# Altium schematic symbol library jlcpcb_2025_04_resistors_extended_0201.schlib: 1508 symbols (part 5 of 8) (continued)
## RC0201FR-07178KL
designator R?  Resistance: 178kΩ  (hidden comment: *)
Resistor, 178kΩ, ±1%, 50mW, ±200ppm/℃, -55℃~+125℃, SMD 0201; Manufacturer: Uniroyal; Manufacturer Part Number: RC0201FR-07178KL; Supplier 1: LCSC; Supplier Part Number 1: C474554; JLCPCB Part Number: C474554; Power Rating: 50mW; Category: Resistors; Package Size: 0201; JLCPCB Basic Part: Yes; Tolerance: ±1%; Temperature Coefficient: ±200ppm/℃; Temperature Rating: -55℃~+125℃; ComponentLink1Description: Datasheet; ComponentLink1URL: https://wmsc.lcsc.com/wmsc/upload/file/pdf/v2/lcsc/2311211101_YAGEO-RC0201FR-07178KL_C474554.pdf; ComponentLink2Description: JLCPCB Part URL; ComponentLink2URL: https://jlcpcb.com/partdetail/C474554
pins: 1, 2
1 alternate drawing of the same symbol

## RC0201FR-07180KL
designator R?  Resistance: 180kΩ  (hidden comment: *)
Resistor, 180kΩ, ±1%, 50mW, 25V, ±200ppm/℃, -55℃~+125℃, SMD 0201; Manufacturer: Uniroyal; Manufacturer Part Number: RC0201FR-07180KL; Supplier 1: LCSC; Supplier Part Number 1: C295779; JLCPCB Part Number: C295779; Power Rating: 50mW; Category: Resistors; Package Size: 0201; JLCPCB Basic Part: Yes; Tolerance: ±1%; Voltage Rating: 25V; Temperature Coefficient: ±200ppm/℃; Temperature Rating: -55℃~+125℃; ComponentLink1Description: Datasheet; ComponentLink1URL: https://wmsc.lcsc.com/wmsc/upload/file/pdf/v2/lcsc/2304140030_YAGEO-RC0201FR-07180KL_C295779.pdf; ComponentLink2Description: JLCPCB Part URL; ComponentLink2URL: https://jlcpcb.com/partdetail/C295779
pins: 1, 2
1 alternate drawing of the same symbol

## RC0201FR-07180RL
designator R?  Resistance: 180Ω  (hidden comment: *)
Resistor, 180Ω, ±1%, 50mW, 25V, ±200ppm/℃, -55℃~+125℃, SMD 0201; Manufacturer: Uniroyal; Manufacturer Part Number: RC0201FR-07180RL; Supplier 1: LCSC; Supplier Part Number 1: C138168; JLCPCB Part Number: C138168; Power Rating: 50mW; Category: Resistors; Package Size: 0201; JLCPCB Basic Part: Yes; Tolerance: ±1%; Voltage Rating: 25V; Temperature Coefficient: ±200ppm/℃; Temperature Rating: -55℃~+125℃; ComponentLink1Description: Datasheet; ComponentLink1URL: https://wmsc.lcsc.com/wmsc/upload/file/pdf/v2/lcsc/2304140030_YAGEO-RC0201FR-07180RL_C138168.pdf; ComponentLink2Description: JLCPCB Part URL; ComponentLink2URL: https://jlcpcb.com/partdetail/C138168
pins: 1, 2
1 alternate drawing of the same symbol

## RC0201FR-07182KL
designator R?  Resistance: 182kΩ  (hidden comment: *)
Resistor, 182kΩ, ±1%, 50mW, 25V, ±200ppm/℃, -55℃~+125℃, SMD 0201; Manufacturer: Uniroyal; Manufacturer Part Number: RC0201FR-07182KL; Supplier 1: LCSC; Supplier Part Number 1: C474559; JLCPCB Part Number: C474559; Power Rating: 50mW; Category: Resistors; Package Size: 0201; JLCPCB Basic Part: Yes; Tolerance: ±1%; Voltage Rating: 25V; Temperature Coefficient: ±200ppm/℃; Temperature Rating: -55℃~+125℃; ComponentLink1Description: Datasheet; ComponentLink1URL: https://wmsc.lcsc.com/wmsc/upload/file/pdf/v2/lcsc/2311211101_YAGEO-RC0201FR-07182KL_C474559.pdf; ComponentLink2Description: JLCPCB Part URL; ComponentLink2URL: https://jlcpcb.com/partdetail/C474559
pins: 1, 2
1 alternate drawing of the same symbol

## RC0201FR-07187KL
designator R?  Resistance: 187kΩ  (hidden comment: *)
Resistor, 187kΩ, ±1%, 50mW, ±200ppm/℃, -55℃~+125℃, SMD 0201; Manufacturer: Uniroyal; Manufacturer Part Number: RC0201FR-07187KL; Supplier 1: LCSC; Supplier Part Number 1: C474561; JLCPCB Part Number: C474561; Power Rating: 50mW; Category: Resistors; Package Size: 0201; JLCPCB Basic Part: Yes; Tolerance: ±1%; Temperature Coefficient: ±200ppm/℃; Temperature Rating: -55℃~+125℃; ComponentLink1Description: Datasheet; ComponentLink1URL: https://wmsc.lcsc.com/wmsc/upload/file/pdf/v2/lcsc/2311211101_YAGEO-RC0201FR-07187KL_C474561.pdf; ComponentLink2Description: JLCPCB Part URL; ComponentLink2URL: https://jlcpcb.com/partdetail/C474561
pins: 1, 2
1 alternate drawing of the same symbol

## RC0201FR-07196KL
designator R?  Resistance: 196kΩ  (hidden comment: *)
Resistor, 196kΩ, ±1%, 50mW, 25V, ±200ppm/℃, -55℃~+125℃, SMD 0201; Manufacturer: Uniroyal; Manufacturer Part Number: RC0201FR-07196KL; Supplier 1: LCSC; Supplier Part Number 1: C273319; JLCPCB Part Number: C273319; Power Rating: 50mW; Category: Resistors; Package Size: 0201; JLCPCB Basic Part: Yes; Tolerance: ±1%; Voltage Rating: 25V; Temperature Coefficient: ±200ppm/℃; Temperature Rating: -55℃~+125℃; ComponentLink1Description: Datasheet; ComponentLink1URL: https://wmsc.lcsc.com/wmsc/upload/file/pdf/v2/lcsc/2304140030_YAGEO-RC0201FR-07196KL_C273319.pdf; ComponentLink2Description: JLCPCB Part URL; ComponentLink2URL: https://jlcpcb.com/partdetail/C273319
pins: 1, 2
1 alternate drawing of the same symbol

## RC0201FR-07196RL
designator R?  Resistance: 196Ω  (hidden comment: *)
Resistor, 196Ω, ±1%, 50mW, 25V, ±200ppm/℃, -55℃~+125℃, SMD 0201; Manufacturer: Uniroyal; Manufacturer Part Number: RC0201FR-07196RL; Supplier 1: LCSC; Supplier Part Number 1: C138167; JLCPCB Part Number: C138167; Power Rating: 50mW; Category: Resistors; Package Size: 0201; JLCPCB Basic Part: Yes; Tolerance: ±1%; Voltage Rating: 25V; Temperature Coefficient: ±200ppm/℃; Temperature Rating: -55℃~+125℃; ComponentLink1Description: Datasheet; ComponentLink1URL: https://wmsc.lcsc.com/wmsc/upload/file/pdf/v2/lcsc/2304140030_YAGEO-RC0201FR-07196RL_C138167.pdf; ComponentLink2Description: JLCPCB Part URL; ComponentLink2URL: https://jlcpcb.com/partdetail/C138167
pins: 1, 2
1 alternate drawing of the same symbol

## RC0201FR-07200KL
designator R?  Resistance: 200kΩ  (hidden comment: *)
Resistor, 200kΩ, ±1%, 50mW, 25V, ±200ppm/℃, -55℃~+125℃, SMD 0201; Manufacturer: Uniroyal; Manufacturer Part Number: RC0201FR-07200KL; Supplier 1: LCSC; Supplier Part Number 1: C138163; JLCPCB Part Number: C138163; Power Rating: 50mW; Category: Resistors; Package Size: 0201; JLCPCB Basic Part: Yes; Tolerance: ±1%; Voltage Rating: 25V; Temperature Coefficient: ±200ppm/℃; Temperature Rating: -55℃~+125℃; ComponentLink1Description: Datasheet; ComponentLink1URL: https://wmsc.lcsc.com/wmsc/upload/file/pdf/v2/lcsc/2304140030_YAGEO-RC0201FR-07200KL_C138163.pdf; ComponentLink2Description: JLCPCB Part URL; ComponentLink2URL: https://jlcpcb.com/partdetail/C138163
pins: 1, 2
1 alternate drawing of the same symbol

## RC0201FR-07200RL
designator R?  Resistance: 200Ω  (hidden comment: *)
Resistor, 200Ω, ±1%, 50mW, 25V, ±200ppm/℃, -55℃~+125℃, SMD 0201; Manufacturer: Uniroyal; Manufacturer Part Number: RC0201FR-07200RL; Supplier 1: LCSC; Supplier Part Number 1: C274337; JLCPCB Part Number: C274337; Power Rating: 50mW; Category: Resistors; Package Size: 0201; JLCPCB Basic Part: Yes; Tolerance: ±1%; Voltage Rating: 25V; Temperature Coefficient: ±200ppm/℃; Temperature Rating: -55℃~+125℃; ComponentLink1Description: Datasheet; ComponentLink1URL: https://wmsc.lcsc.com/wmsc/upload/file/pdf/v2/lcsc/2304140030_YAGEO-RC0201FR-07200RL_C274337.pdf; ComponentLink2Description: JLCPCB Part URL; ComponentLink2URL: https://jlcpcb.com/partdetail/C274337
pins: 1, 2
1 alternate drawing of the same symbol

## RC0201FR-07210RL
designator R?  Resistance: 210Ω  (hidden comment: *)
Resistor, 210Ω, ±1%, 50mW, 25V, ±200ppm/℃, -55℃~+125℃, SMD 0201; Manufacturer: Uniroyal; Manufacturer Part Number: RC0201FR-07210RL; Supplier 1: LCSC; Supplier Part Number 1: C474604; JLCPCB Part Number: C474604; Power Rating: 50mW; Category: Resistors; Package Size: 0201; JLCPCB Basic Part: Yes; Tolerance: ±1%; Voltage Rating: 25V; Temperature Coefficient: ±200ppm/℃; Temperature Rating: -55℃~+125℃; ComponentLink1Description: Datasheet; ComponentLink1URL: https://wmsc.lcsc.com/wmsc/upload/file/pdf/v2/lcsc/2311211101_YAGEO-RC0201FR-07210RL_C474604.pdf; ComponentLink2Description: JLCPCB Part URL; ComponentLink2URL: https://jlcpcb.com/partdetail/C474604
pins: 1, 2
1 alternate drawing of the same symbol

## RC0201FR-07215KL
designator R?  Resistance: 215kΩ  (hidden comment: *)
Resistor, 215kΩ, ±1%, 50mW, ±200ppm/℃, -55℃~+125℃, SMD 0201; Manufacturer: Uniroyal; Manufacturer Part Number: RC0201FR-07215KL; Supplier 1: LCSC; Supplier Part Number 1: C474605; JLCPCB Part Number: C474605; Power Rating: 50mW; Category: Resistors; Package Size: 0201; JLCPCB Basic Part: Yes; Tolerance: ±1%; Temperature Coefficient: ±200ppm/℃; Temperature Rating: -55℃~+125℃; ComponentLink1Description: Datasheet; ComponentLink1URL: https://wmsc.lcsc.com/wmsc/upload/file/pdf/v2/lcsc/2311211101_YAGEO-RC0201FR-07215KL_C474605.pdf; ComponentLink2Description: JLCPCB Part URL; ComponentLink2URL: https://jlcpcb.com/partdetail/C474605
pins: 1, 2
1 alternate drawing of the same symbol

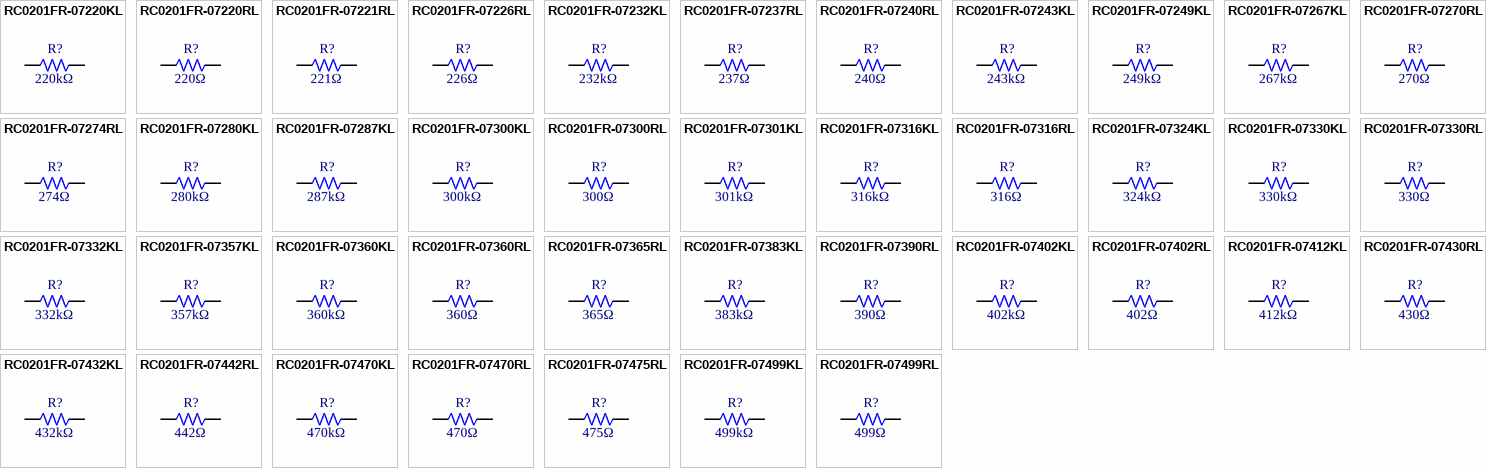
[diagram p21: symbols RC0201FR-07220KL to RC0201FR-07499RL]

## RC0201FR-07220KL
designator R?  Resistance: 220kΩ  (hidden comment: *)
Resistor, 220kΩ, ±1%, 50mW, 25V, ±200ppm/℃, -55℃~+125℃, SMD 0201; Manufacturer: Uniroyal; Manufacturer Part Number: RC0201FR-07220KL; Supplier 1: LCSC; Supplier Part Number 1: C142020; JLCPCB Part Number: C142020; Power Rating: 50mW; Category: Resistors; Package Size: 0201; JLCPCB Basic Part: Yes; Tolerance: ±1%; Voltage Rating: 25V; Temperature Coefficient: ±200ppm/℃; Temperature Rating: -55℃~+125℃; ComponentLink1Description: Datasheet; ComponentLink1URL: https://wmsc.lcsc.com/wmsc/upload/file/pdf/v2/lcsc/2304140030_YAGEO-RC0201FR-07220KL_C142020.pdf; ComponentLink2Description: JLCPCB Part URL; ComponentLink2URL: https://jlcpcb.com/partdetail/C142020
pins: 1, 2
1 alternate drawing of the same symbol

## RC0201FR-07220RL
designator R?  Resistance: 220Ω  (hidden comment: *)
Resistor, 220Ω, ±1%, 50mW, 25V, ±200ppm/℃, -55℃~+125℃, SMD 0201; Manufacturer: Uniroyal; Manufacturer Part Number: RC0201FR-07220RL; Supplier 1: LCSC; Supplier Part Number 1: C274342; JLCPCB Part Number: C274342; Power Rating: 50mW; Category: Resistors; Package Size: 0201; JLCPCB Basic Part: Yes; Tolerance: ±1%; Voltage Rating: 25V; Temperature Coefficient: ±200ppm/℃; Temperature Rating: -55℃~+125℃; ComponentLink1Description: Datasheet; ComponentLink1URL: https://wmsc.lcsc.com/wmsc/upload/file/pdf/v2/lcsc/2304140030_YAGEO-RC0201FR-07220RL_C274342.pdf; ComponentLink2Description: JLCPCB Part URL; ComponentLink2URL: https://jlcpcb.com/partdetail/C274342
pins: 1, 2
1 alternate drawing of the same symbol

## RC0201FR-07221RL
designator R?  Resistance: 221Ω  (hidden comment: *)
Resistor, 221Ω, ±1%, 50mW, 25V, ±200ppm/℃, -55℃~+125℃, SMD 0201; Manufacturer: Uniroyal; Manufacturer Part Number: RC0201FR-07221RL; Supplier 1: LCSC; Supplier Part Number 1: C138161; JLCPCB Part Number: C138161; Power Rating: 50mW; Category: Resistors; Package Size: 0201; JLCPCB Basic Part: Yes; Tolerance: ±1%; Voltage Rating: 25V; Temperature Coefficient: ±200ppm/℃; Temperature Rating: -55℃~+125℃; ComponentLink1Description: Datasheet; ComponentLink1URL: https://wmsc.lcsc.com/wmsc/upload/file/pdf/v2/lcsc/2304140030_YAGEO-RC0201FR-07221RL_C138161.pdf; ComponentLink2Description: JLCPCB Part URL; ComponentLink2URL: https://jlcpcb.com/partdetail/C138161
pins: 1, 2
1 alternate drawing of the same symbol

## RC0201FR-07226RL
designator R?  Resistance: 226Ω  (hidden comment: *)
Resistor, 226Ω, ±1%, 50mW, ±200ppm/℃, -55℃~+125℃, SMD 0201; Manufacturer: Uniroyal; Manufacturer Part Number: RC0201FR-07226RL; Supplier 1: LCSC; Supplier Part Number 1: C474611; JLCPCB Part Number: C474611; Power Rating: 50mW; Category: Resistors; Package Size: 0201; JLCPCB Basic Part: Yes; Tolerance: ±1%; Temperature Coefficient: ±200ppm/℃; Temperature Rating: -55℃~+125℃; ComponentLink1Description: Datasheet; ComponentLink1URL: https://wmsc.lcsc.com/wmsc/upload/file/pdf/v2/lcsc/2311211101_YAGEO-RC0201FR-07226RL_C474611.pdf; ComponentLink2Description: JLCPCB Part URL; ComponentLink2URL: https://jlcpcb.com/partdetail/C474611
pins: 1, 2
1 alternate drawing of the same symbol

## RC0201FR-07232KL
designator R?  Resistance: 232kΩ  (hidden comment: *)
Resistor, 232kΩ, ±1%, 50mW, 25V, ±200ppm/℃, -55℃~+125℃, SMD 0201; Manufacturer: Uniroyal; Manufacturer Part Number: RC0201FR-07232KL; Supplier 1: LCSC; Supplier Part Number 1: C138160; JLCPCB Part Number: C138160; Power Rating: 50mW; Category: Resistors; Package Size: 0201; JLCPCB Basic Part: Yes; Tolerance: ±1%; Voltage Rating: 25V; Temperature Coefficient: ±200ppm/℃; Temperature Rating: -55℃~+125℃; ComponentLink1Description: Datasheet; ComponentLink1URL: https://wmsc.lcsc.com/wmsc/upload/file/pdf/v2/lcsc/2304140030_YAGEO-RC0201FR-07232KL_C138160.pdf; ComponentLink2Description: JLCPCB Part URL; ComponentLink2URL: https://jlcpcb.com/partdetail/C138160
pins: 1, 2
1 alternate drawing of the same symbol

## RC0201FR-07237RL
designator R?  Resistance: 237Ω  (hidden comment: *)
Resistor, 237Ω, ±1%, 50mW, ±200ppm/℃, -55℃~+125℃, SMD 0201; Manufacturer: Uniroyal; Manufacturer Part Number: RC0201FR-07237RL; Supplier 1: LCSC; Supplier Part Number 1: C474618; JLCPCB Part Number: C474618; Power Rating: 50mW; Category: Resistors; Package Size: 0201; JLCPCB Basic Part: Yes; Tolerance: ±1%; Temperature Coefficient: ±200ppm/℃; Temperature Rating: -55℃~+125℃; ComponentLink1Description: Datasheet; ComponentLink1URL: https://wmsc.lcsc.com/wmsc/upload/file/pdf/v2/lcsc/2311211101_YAGEO-RC0201FR-07237RL_C474618.pdf; ComponentLink2Description: JLCPCB Part URL; ComponentLink2URL: https://jlcpcb.com/partdetail/C474618
pins: 1, 2
1 alternate drawing of the same symbol

## RC0201FR-07240RL
designator R?  Resistance: 240Ω  (hidden comment: *)
Resistor, 240Ω, ±1%, 50mW, 25V, ±200ppm/℃, -55℃~+125℃, SMD 0201; Manufacturer: Uniroyal; Manufacturer Part Number: RC0201FR-07240RL; Supplier 1: LCSC; Supplier Part Number 1: C155745; JLCPCB Part Number: C155745; Power Rating: 50mW; Category: Resistors; Package Size: 0201; JLCPCB Basic Part: Yes; Tolerance: ±1%; Voltage Rating: 25V; Temperature Coefficient: ±200ppm/℃; Temperature Rating: -55℃~+125℃; ComponentLink1Description: Datasheet; ComponentLink1URL: https://wmsc.lcsc.com/wmsc/upload/file/pdf/v2/lcsc/2304140030_YAGEO-RC0201FR-07240RL_C155745.pdf; ComponentLink2Description: JLCPCB Part URL; ComponentLink2URL: https://jlcpcb.com/partdetail/C155745
pins: 1, 2
1 alternate drawing of the same symbol

## RC0201FR-07243KL
designator R?  Resistance: 243kΩ  (hidden comment: *)
Resistor, 243kΩ, ±1%, 50mW, 25V, ±200ppm/℃, -55℃~+125℃, SMD 0201; Manufacturer: Uniroyal; Manufacturer Part Number: RC0201FR-07243KL; Supplier 1: LCSC; Supplier Part Number 1: C295790; JLCPCB Part Number: C295790; Power Rating: 50mW; Category: Resistors; Package Size: 0201; JLCPCB Basic Part: Yes; Tolerance: ±1%; Voltage Rating: 25V; Temperature Coefficient: ±200ppm/℃; Temperature Rating: -55℃~+125℃; ComponentLink1Description: Datasheet; ComponentLink1URL: https://wmsc.lcsc.com/wmsc/upload/file/pdf/v2/lcsc/2304140030_YAGEO-RC0201FR-07243KL_C295790.pdf; ComponentLink2Description: JLCPCB Part URL; ComponentLink2URL: https://jlcpcb.com/partdetail/C295790
pins: 1, 2
1 alternate drawing of the same symbol

## RC0201FR-07249KL
designator R?  Resistance: 249kΩ  (hidden comment: *)
Resistor, 249kΩ, ±1%, 50mW, 15V, ±200ppm/℃, -55℃~+125℃, SMD 0201; Manufacturer: Uniroyal; Manufacturer Part Number: RC0201FR-07249KL; Supplier 1: LCSC; Supplier Part Number 1: C273273; JLCPCB Part Number: C273273; Power Rating: 50mW; Category: Resistors; Package Size: 0201; JLCPCB Basic Part: Yes; Tolerance: ±1%; Voltage Rating: 15V; Temperature Coefficient: ±200ppm/℃; Temperature Rating: -55℃~+125℃; ComponentLink1Description: Datasheet; ComponentLink1URL: https://wmsc.lcsc.com/wmsc/upload/file/pdf/v2/lcsc/2112131830_YAGEO-RC0201FR-07249KL_C273273.pdf; ComponentLink2Description: JLCPCB Part URL; ComponentLink2URL: https://jlcpcb.com/partdetail/C273273
pins: 1, 2
1 alternate drawing of the same symbol

## RC0201FR-07267KL
designator R?  Resistance: 267kΩ  (hidden comment: *)
Resistor, 267kΩ, ±1%, 50mW, 25V, ±200ppm/℃, -55℃~+125℃, SMD 0201; Manufacturer: Uniroyal; Manufacturer Part Number: RC0201FR-07267KL; Supplier 1: LCSC; Supplier Part Number 1: C364368; JLCPCB Part Number: C364368; Power Rating: 50mW; Category: Resistors; Package Size: 0201; JLCPCB Basic Part: Yes; Tolerance: ±1%; Voltage Rating: 25V; Temperature Coefficient: ±200ppm/℃; Temperature Rating: -55℃~+125℃; ComponentLink1Description: Datasheet; ComponentLink1URL: https://wmsc.lcsc.com/wmsc/upload/file/pdf/v2/lcsc/1912111437_YAGEO-RC0201FR-07267KL_C364368.pdf; ComponentLink2Description: JLCPCB Part URL; ComponentLink2URL: https://jlcpcb.com/partdetail/C364368
pins: 1, 2
1 alternate drawing of the same symbol

## RC0201FR-07270RL
designator R?  Resistance: 270Ω  (hidden comment: *)
Resistor, 270Ω, ±1%, 50mW, 25V, ±200ppm/℃, -55℃~+125℃, SMD 0201; Manufacturer: Uniroyal; Manufacturer Part Number: RC0201FR-07270RL; Supplier 1: LCSC; Supplier Part Number 1: C295793; JLCPCB Part Number: C295793; Power Rating: 50mW; Category: Resistors; Package Size: 0201; JLCPCB Basic Part: Yes; Tolerance: ±1%; Voltage Rating: 25V; Temperature Coefficient: ±200ppm/℃; Temperature Rating: -55℃~+125℃; ComponentLink1Description: Datasheet; ComponentLink1URL: https://wmsc.lcsc.com/wmsc/upload/file/pdf/v2/lcsc/2304140030_YAGEO-RC0201FR-07270RL_C295793.pdf; ComponentLink2Description: JLCPCB Part URL; ComponentLink2URL: https://jlcpcb.com/partdetail/C295793
pins: 1, 2
1 alternate drawing of the same symbol

## RC0201FR-07274RL
designator R?  Resistance: 274Ω  (hidden comment: *)
Resistor, 274Ω, ±1%, 50mW, ±200ppm/℃, -55℃~+125℃, SMD 0201; Manufacturer: Uniroyal; Manufacturer Part Number: RC0201FR-07274RL; Supplier 1: LCSC; Supplier Part Number 1: C474632; JLCPCB Part Number: C474632; Power Rating: 50mW; Category: Resistors; Package Size: 0201; JLCPCB Basic Part: Yes; Tolerance: ±1%; Temperature Coefficient: ±200ppm/℃; Temperature Rating: -55℃~+125℃; ComponentLink1Description: Datasheet; ComponentLink1URL: https://wmsc.lcsc.com/wmsc/upload/file/pdf/v2/lcsc/2311211101_YAGEO-RC0201FR-07274RL_C474632.pdf; ComponentLink2Description: JLCPCB Part URL; ComponentLink2URL: https://jlcpcb.com/partdetail/C474632
pins: 1, 2
1 alternate drawing of the same symbol

## RC0201FR-07280KL
designator R?  Resistance: 280kΩ  (hidden comment: *)
Resistor, 280kΩ, ±1%, 50mW, 25V, ±200ppm/℃, -55℃~+125℃, SMD 0201; Manufacturer: Uniroyal; Manufacturer Part Number: RC0201FR-07280KL; Supplier 1: LCSC; Supplier Part Number 1: C474634; JLCPCB Part Number: C474634; Power Rating: 50mW; Category: Resistors; Package Size: 0201; JLCPCB Basic Part: Yes; Tolerance: ±1%; Voltage Rating: 25V; Temperature Coefficient: ±200ppm/℃; Temperature Rating: -55℃~+125℃; ComponentLink1Description: Datasheet; ComponentLink1URL: https://wmsc.lcsc.com/wmsc/upload/file/pdf/v2/lcsc/2311211101_YAGEO-RC0201FR-07280KL_C474634.pdf; ComponentLink2Description: JLCPCB Part URL; ComponentLink2URL: https://jlcpcb.com/partdetail/C474634
pins: 1, 2
1 alternate drawing of the same symbol

## RC0201FR-07287KL
designator R?  Resistance: 287kΩ  (hidden comment: *)
Resistor, 287kΩ, ±1%, 50mW, ±200ppm/℃, -55℃~+125℃, SMD 0201; Manufacturer: Uniroyal; Manufacturer Part Number: RC0201FR-07287KL; Supplier 1: LCSC; Supplier Part Number 1: C474636; JLCPCB Part Number: C474636; Power Rating: 50mW; Category: Resistors; Package Size: 0201; JLCPCB Basic Part: Yes; Tolerance: ±1%; Temperature Coefficient: ±200ppm/℃; Temperature Rating: -55℃~+125℃; ComponentLink1Description: Datasheet; ComponentLink1URL: https://wmsc.lcsc.com/wmsc/upload/file/pdf/v2/lcsc/2311211101_YAGEO-RC0201FR-07287KL_C474636.pdf; ComponentLink2Description: JLCPCB Part URL; ComponentLink2URL: https://jlcpcb.com/partdetail/C474636
pins: 1, 2
1 alternate drawing of the same symbol

## RC0201FR-07300KL
designator R?  Resistance: 300kΩ  (hidden comment: *)
Resistor, 300kΩ, ±1%, 50mW, 25V, ±200ppm/℃, -55℃~+125℃, SMD 0201; Manufacturer: Uniroyal; Manufacturer Part Number: RC0201FR-07300KL; Supplier 1: LCSC; Supplier Part Number 1: C274871; JLCPCB Part Number: C274871; Power Rating: 50mW; Category: Resistors; Package Size: 0201; JLCPCB Basic Part: Yes; Tolerance: ±1%; Voltage Rating: 25V; Temperature Coefficient: ±200ppm/℃; Temperature Rating: -55℃~+125℃; ComponentLink1Description: Datasheet; ComponentLink1URL: https://wmsc.lcsc.com/wmsc/upload/file/pdf/v2/lcsc/2304140030_YAGEO-RC0201FR-07300KL_C274871.pdf; ComponentLink2Description: JLCPCB Part URL; ComponentLink2URL: https://jlcpcb.com/partdetail/C274871
pins: 1, 2
1 alternate drawing of the same symbol

## RC0201FR-07300RL
designator R?  Resistance: 300Ω  (hidden comment: *)
Resistor, 300Ω, ±1%, 50mW, 25V, ±200ppm/℃, -55℃~+125℃, SMD 0201; Manufacturer: Uniroyal; Manufacturer Part Number: RC0201FR-07300RL; Supplier 1: LCSC; Supplier Part Number 1: C273296; JLCPCB Part Number: C273296; Power Rating: 50mW; Category: Resistors; Package Size: 0201; JLCPCB Basic Part: Yes; Tolerance: ±1%; Voltage Rating: 25V; Temperature Coefficient: ±200ppm/℃; Temperature Rating: -55℃~+125℃; ComponentLink1Description: Datasheet; ComponentLink1URL: https://wmsc.lcsc.com/wmsc/upload/file/pdf/v2/lcsc/2304140030_YAGEO-RC0201FR-07300RL_C273296.pdf; ComponentLink2Description: JLCPCB Part URL; ComponentLink2URL: https://jlcpcb.com/partdetail/C273296
pins: 1, 2
1 alternate drawing of the same symbol

## RC0201FR-07301KL
designator R?  Resistance: 301kΩ  (hidden comment: *)
Resistor, 301kΩ, ±1%, 50mW, 25V, ±200ppm/℃, -55℃~+125℃, SMD 0201; Manufacturer: Uniroyal; Manufacturer Part Number: RC0201FR-07301KL; Supplier 1: LCSC; Supplier Part Number 1: C77621; JLCPCB Part Number: C77621; Power Rating: 50mW; Category: Resistors; Package Size: 0201; JLCPCB Basic Part: Yes; Tolerance: ±1%; Voltage Rating: 25V; Temperature Coefficient: ±200ppm/℃; Temperature Rating: -55℃~+125℃; ComponentLink1Description: Datasheet; ComponentLink1URL: https://wmsc.lcsc.com/wmsc/upload/file/pdf/v2/lcsc/2304140030_YAGEO-RC0201FR-07301KL_C77621.pdf; ComponentLink2Description: JLCPCB Part URL; ComponentLink2URL: https://jlcpcb.com/partdetail/C77621
pins: 1, 2
1 alternate drawing of the same symbol

## RC0201FR-07316KL
designator R?  Resistance: 316kΩ  (hidden comment: *)
Resistor, 316kΩ, ±1%, 50mW, 25V, ±200ppm/℃, -55℃~+125℃, SMD 0201; Manufacturer: Uniroyal; Manufacturer Part Number: RC0201FR-07316KL; Supplier 1: LCSC; Supplier Part Number 1: C138152; JLCPCB Part Number: C138152; Power Rating: 50mW; Category: Resistors; Package Size: 0201; JLCPCB Basic Part: Yes; Tolerance: ±1%; Voltage Rating: 25V; Temperature Coefficient: ±200ppm/℃; Temperature Rating: -55℃~+125℃; ComponentLink1Description: Datasheet; ComponentLink1URL: https://wmsc.lcsc.com/wmsc/upload/file/pdf/v2/lcsc/2304140030_YAGEO-RC0201FR-07316KL_C138152.pdf; ComponentLink2Description: JLCPCB Part URL; ComponentLink2URL: https://jlcpcb.com/partdetail/C138152
pins: 1, 2
1 alternate drawing of the same symbol

## RC0201FR-07316RL
designator R?  Resistance: 316Ω  (hidden comment: *)
Resistor, 316Ω, ±1%, 50mW, 25V, ±200ppm/℃, -55℃~+125℃, SMD 0201; Manufacturer: Uniroyal; Manufacturer Part Number: RC0201FR-07316RL; Supplier 1: LCSC; Supplier Part Number 1: C138151; JLCPCB Part Number: C138151; Power Rating: 50mW; Category: Resistors; Package Size: 0201; JLCPCB Basic Part: Yes; Tolerance: ±1%; Voltage Rating: 25V; Temperature Coefficient: ±200ppm/℃; Temperature Rating: -55℃~+125℃; ComponentLink1Description: Datasheet; ComponentLink1URL: https://wmsc.lcsc.com/wmsc/upload/file/pdf/v2/lcsc/2304140030_YAGEO-RC0201FR-07316RL_C138151.pdf; ComponentLink2Description: JLCPCB Part URL; ComponentLink2URL: https://jlcpcb.com/partdetail/C138151
pins: 1, 2
1 alternate drawing of the same symbol

## RC0201FR-07324KL
designator R?  Resistance: 324kΩ  (hidden comment: *)
Resistor, 324kΩ, ±1%, 50mW, ±200ppm/℃, -55℃~+125℃, SMD 0201; Manufacturer: Uniroyal; Manufacturer Part Number: RC0201FR-07324KL; Supplier 1: LCSC; Supplier Part Number 1: C474680; JLCPCB Part Number: C474680; Power Rating: 50mW; Category: Resistors; Package Size: 0201; JLCPCB Basic Part: Yes; Tolerance: ±1%; Temperature Coefficient: ±200ppm/℃; Temperature Rating: -55℃~+125℃; ComponentLink1Description: Datasheet; ComponentLink1URL: https://wmsc.lcsc.com/wmsc/upload/file/pdf/v2/lcsc/2311211101_YAGEO-RC0201FR-07324KL_C474680.pdf; ComponentLink2Description: JLCPCB Part URL; ComponentLink2URL: https://jlcpcb.com/partdetail/C474680
pins: 1, 2
1 alternate drawing of the same symbol

## RC0201FR-07330KL
designator R?  Resistance: 330kΩ  (hidden comment: *)
Resistor, 330kΩ, ±1%, 50mW, 25V, ±200ppm/℃, -55℃~+125℃, SMD 0201; Manufacturer: Uniroyal; Manufacturer Part Number: RC0201FR-07330KL; Supplier 1: LCSC; Supplier Part Number 1: C142017; JLCPCB Part Number: C142017; Power Rating: 50mW; Category: Resistors; Package Size: 0201; JLCPCB Basic Part: Yes; Tolerance: ±1%; Voltage Rating: 25V; Temperature Coefficient: ±200ppm/℃; Temperature Rating: -55℃~+125℃; ComponentLink1Description: Datasheet; ComponentLink1URL: https://wmsc.lcsc.com/wmsc/upload/file/pdf/v2/lcsc/2304140030_YAGEO-RC0201FR-07330KL_C142017.pdf; ComponentLink2Description: JLCPCB Part URL; ComponentLink2URL: https://jlcpcb.com/partdetail/C142017
pins: 1, 2
1 alternate drawing of the same symbol

## RC0201FR-07330RL
designator R?  Resistance: 330Ω  (hidden comment: *)
Resistor, 330Ω, ±1%, 50mW, 25V, ±200ppm/℃, -55℃~+125℃, SMD 0201; Manufacturer: Uniroyal; Manufacturer Part Number: RC0201FR-07330RL; Supplier 1: LCSC; Supplier Part Number 1: C274872; JLCPCB Part Number: C274872; Power Rating: 50mW; Category: Resistors; Package Size: 0201; JLCPCB Basic Part: Yes; Tolerance: ±1%; Voltage Rating: 25V; Temperature Coefficient: ±200ppm/℃; Temperature Rating: -55℃~+125℃; ComponentLink1Description: Datasheet; ComponentLink1URL: https://wmsc.lcsc.com/wmsc/upload/file/pdf/v2/lcsc/2304140030_YAGEO-RC0201FR-07330RL_C274872.pdf; ComponentLink2Description: JLCPCB Part URL; ComponentLink2URL: https://jlcpcb.com/partdetail/C274872
pins: 1, 2
1 alternate drawing of the same symbol

## RC0201FR-07332KL
designator R?  Resistance: 332kΩ  (hidden comment: *)
Resistor, 332kΩ, ±1%, 50mW, 25V, ±200ppm/℃, -55℃~+125℃, SMD 0201; Manufacturer: Uniroyal; Manufacturer Part Number: RC0201FR-07332KL; Supplier 1: LCSC; Supplier Part Number 1: C474682; JLCPCB Part Number: C474682; Power Rating: 50mW; Category: Resistors; Package Size: 0201; JLCPCB Basic Part: Yes; Tolerance: ±1%; Voltage Rating: 25V; Temperature Coefficient: ±200ppm/℃; Temperature Rating: -55℃~+125℃; ComponentLink1Description: Datasheet; ComponentLink1URL: https://wmsc.lcsc.com/wmsc/upload/file/pdf/v2/lcsc/2311211101_YAGEO-RC0201FR-07332KL_C474682.pdf; ComponentLink2Description: JLCPCB Part URL; ComponentLink2URL: https://jlcpcb.com/partdetail/C474682
pins: 1, 2
1 alternate drawing of the same symbol

## RC0201FR-07357KL
designator R?  Resistance: 357kΩ  (hidden comment: *)
Resistor, 357kΩ, ±1%, 50mW, 25V, ±200ppm/℃, -55℃~+125℃, SMD 0201; Manufacturer: Uniroyal; Manufacturer Part Number: RC0201FR-07357KL; Supplier 1: LCSC; Supplier Part Number 1: C138148; JLCPCB Part Number: C138148; Power Rating: 50mW; Category: Resistors; Package Size: 0201; JLCPCB Basic Part: Yes; Tolerance: ±1%; Voltage Rating: 25V; Temperature Coefficient: ±200ppm/℃; Temperature Rating: -55℃~+125℃; ComponentLink1Description: Datasheet; ComponentLink1URL: https://wmsc.lcsc.com/wmsc/upload/file/pdf/v2/lcsc/2304140030_YAGEO-RC0201FR-07357KL_C138148.pdf; ComponentLink2Description: JLCPCB Part URL; ComponentLink2URL: https://jlcpcb.com/partdetail/C138148
pins: 1, 2
1 alternate drawing of the same symbol

## RC0201FR-07360KL
designator R?  Resistance: 360kΩ  (hidden comment: *)
Resistor, 360kΩ, ±1%, 50mW, 25V, ±200ppm/℃, -55℃~+125℃, SMD 0201; Manufacturer: Uniroyal; Manufacturer Part Number: RC0201FR-07360KL; Supplier 1: LCSC; Supplier Part Number 1: C295795; JLCPCB Part Number: C295795; Power Rating: 50mW; Category: Resistors; Package Size: 0201; JLCPCB Basic Part: Yes; Tolerance: ±1%; Voltage Rating: 25V; Temperature Coefficient: ±200ppm/℃; Temperature Rating: -55℃~+125℃; ComponentLink1Description: Datasheet; ComponentLink1URL: https://wmsc.lcsc.com/wmsc/upload/file/pdf/v2/lcsc/2304140030_YAGEO-RC0201FR-07360KL_C295795.pdf; ComponentLink2Description: JLCPCB Part URL; ComponentLink2URL: https://jlcpcb.com/partdetail/C295795
pins: 1, 2
1 alternate drawing of the same symbol

## RC0201FR-07360RL
designator R?  Resistance: 360Ω  (hidden comment: *)
Resistor, 360Ω, ±1%, 50mW, 25V, ±200ppm/℃, -55℃~+125℃, SMD 0201; Manufacturer: Uniroyal; Manufacturer Part Number: RC0201FR-07360RL; Supplier 1: LCSC; Supplier Part Number 1: C138147; JLCPCB Part Number: C138147; Power Rating: 50mW; Category: Resistors; Package Size: 0201; JLCPCB Basic Part: Yes; Tolerance: ±1%; Voltage Rating: 25V; Temperature Coefficient: ±200ppm/℃; Temperature Rating: -55℃~+125℃; ComponentLink1Description: Datasheet; ComponentLink1URL: https://wmsc.lcsc.com/wmsc/upload/file/pdf/v2/lcsc/2304140030_YAGEO-RC0201FR-07360RL_C138147.pdf; ComponentLink2Description: JLCPCB Part URL; ComponentLink2URL: https://jlcpcb.com/partdetail/C138147
pins: 1, 2
1 alternate drawing of the same symbol

## RC0201FR-07365RL
designator R?  Resistance: 365Ω  (hidden comment: *)
Resistor, 365Ω, ±1%, 50mW, 25V, ±200ppm/℃, -55℃~+125℃, SMD 0201; Manufacturer: Uniroyal; Manufacturer Part Number: RC0201FR-07365RL; Supplier 1: LCSC; Supplier Part Number 1: C138146; JLCPCB Part Number: C138146; Power Rating: 50mW; Category: Resistors; Package Size: 0201; JLCPCB Basic Part: Yes; Tolerance: ±1%; Voltage Rating: 25V; Temperature Coefficient: ±200ppm/℃; Temperature Rating: -55℃~+125℃; ComponentLink1Description: Datasheet; ComponentLink1URL: https://wmsc.lcsc.com/wmsc/upload/file/pdf/v2/lcsc/2304140030_YAGEO-RC0201FR-07365RL_C138146.pdf; ComponentLink2Description: JLCPCB Part URL; ComponentLink2URL: https://jlcpcb.com/partdetail/C138146
pins: 1, 2
1 alternate drawing of the same symbol

## RC0201FR-07383KL
designator R?  Resistance: 383kΩ  (hidden comment: *)
Resistor, 383kΩ, ±1%, 50mW, ±200ppm/℃, -55℃~+125℃, SMD 0201; Manufacturer: Uniroyal; Manufacturer Part Number: RC0201FR-07383KL; Supplier 1: LCSC; Supplier Part Number 1: C474698; JLCPCB Part Number: C474698; Power Rating: 50mW; Category: Resistors; Package Size: 0201; JLCPCB Basic Part: Yes; Tolerance: ±1%; Temperature Coefficient: ±200ppm/℃; Temperature Rating: -55℃~+125℃; ComponentLink1Description: Datasheet; ComponentLink1URL: https://wmsc.lcsc.com/wmsc/upload/file/pdf/v2/lcsc/2311211101_YAGEO-RC0201FR-07383KL_C474698.pdf; ComponentLink2Description: JLCPCB Part URL; ComponentLink2URL: https://jlcpcb.com/partdetail/C474698
pins: 1, 2
1 alternate drawing of the same symbol

## RC0201FR-07390RL
designator R?  Resistance: 390Ω  (hidden comment: *)
Resistor, 390Ω, ±1%, 50mW, 25V, ±200ppm/℃, -55℃~+125℃, SMD 0201; Manufacturer: Uniroyal; Manufacturer Part Number: RC0201FR-07390RL; Supplier 1: LCSC; Supplier Part Number 1: C295797; JLCPCB Part Number: C295797; Power Rating: 50mW; Category: Resistors; Package Size: 0201; JLCPCB Basic Part: Yes; Tolerance: ±1%; Voltage Rating: 25V; Temperature Coefficient: ±200ppm/℃; Temperature Rating: -55℃~+125℃; ComponentLink1Description: Datasheet; ComponentLink1URL: https://wmsc.lcsc.com/wmsc/upload/file/pdf/v2/lcsc/1912111437_YAGEO-RC0201FR-07390RL_C295797.pdf; ComponentLink2Description: JLCPCB Part URL; ComponentLink2URL: https://jlcpcb.com/partdetail/C295797
pins: 1, 2
1 alternate drawing of the same symbol

## RC0201FR-07402KL
designator R?  Resistance: 402kΩ  (hidden comment: *)
Resistor, 402kΩ, ±1%, 50mW, 25V, ±200ppm/℃, -55℃~+125℃, SMD 0201; Manufacturer: Uniroyal; Manufacturer Part Number: RC0201FR-07402KL; Supplier 1: LCSC; Supplier Part Number 1: C273291; JLCPCB Part Number: C273291; Power Rating: 50mW; Category: Resistors; Package Size: 0201; JLCPCB Basic Part: Yes; Tolerance: ±1%; Voltage Rating: 25V; Temperature Coefficient: ±200ppm/℃; Temperature Rating: -55℃~+125℃; ComponentLink1Description: Datasheet; ComponentLink1URL: https://wmsc.lcsc.com/wmsc/upload/file/pdf/v2/lcsc/2008251105_YAGEO-RC0201FR-07402KL_C273291.pdf; ComponentLink2Description: JLCPCB Part URL; ComponentLink2URL: https://jlcpcb.com/partdetail/C273291
pins: 1, 2
1 alternate drawing of the same symbol

## RC0201FR-07402RL
designator R?  Resistance: 402Ω  (hidden comment: *)
Resistor, 402Ω, ±1%, 50mW, 25V, ±200ppm/℃, -55℃~+125℃, SMD 0201; Manufacturer: Uniroyal; Manufacturer Part Number: RC0201FR-07402RL; Supplier 1: LCSC; Supplier Part Number 1: C474719; JLCPCB Part Number: C474719; Power Rating: 50mW; Category: Resistors; Package Size: 0201; JLCPCB Basic Part: Yes; Tolerance: ±1%; Voltage Rating: 25V; Temperature Coefficient: ±200ppm/℃; Temperature Rating: -55℃~+125℃; ComponentLink1Description: Datasheet; ComponentLink1URL: https://wmsc.lcsc.com/wmsc/upload/file/pdf/v2/lcsc/2311211101_YAGEO-RC0201FR-07402RL_C474719.pdf; ComponentLink2Description: JLCPCB Part URL; ComponentLink2URL: https://jlcpcb.com/partdetail/C474719
pins: 1, 2
1 alternate drawing of the same symbol

## RC0201FR-07412KL
designator R?  Resistance: 412kΩ  (hidden comment: *)
Resistor, 412kΩ, ±1%, 50mW, ±200ppm/℃, -55℃~+125℃, SMD 0201; Manufacturer: Uniroyal; Manufacturer Part Number: RC0201FR-07412KL; Supplier 1: LCSC; Supplier Part Number 1: C474721; JLCPCB Part Number: C474721; Power Rating: 50mW; Category: Resistors; Package Size: 0201; JLCPCB Basic Part: Yes; Tolerance: ±1%; Temperature Coefficient: ±200ppm/℃; Temperature Rating: -55℃~+125℃; ComponentLink1Description: Datasheet; ComponentLink1URL: https://wmsc.lcsc.com/wmsc/upload/file/pdf/v2/lcsc/2311211101_YAGEO-RC0201FR-07412KL_C474721.pdf; ComponentLink2Description: JLCPCB Part URL; ComponentLink2URL: https://jlcpcb.com/partdetail/C474721
pins: 1, 2
1 alternate drawing of the same symbol

## RC0201FR-07430RL
designator R?  Resistance: 430Ω  (hidden comment: *)
Resistor, 430Ω, ±1%, 50mW, 25V, ±200ppm/℃, -55℃~+125℃, SMD 0201; Manufacturer: Uniroyal; Manufacturer Part Number: RC0201FR-07430RL; Supplier 1: LCSC; Supplier Part Number 1: C295800; JLCPCB Part Number: C295800; Power Rating: 50mW; Category: Resistors; Package Size: 0201; JLCPCB Basic Part: Yes; Tolerance: ±1%; Voltage Rating: 25V; Temperature Coefficient: ±200ppm/℃; Temperature Rating: -55℃~+125℃; ComponentLink1Description: Datasheet; ComponentLink1URL: https://wmsc.lcsc.com/wmsc/upload/file/pdf/v2/lcsc/2304140030_YAGEO-RC0201FR-07430RL_C295800.pdf; ComponentLink2Description: JLCPCB Part URL; ComponentLink2URL: https://jlcpcb.com/partdetail/C295800
pins: 1, 2
1 alternate drawing of the same symbol

## RC0201FR-07432KL
designator R?  Resistance: 432kΩ  (hidden comment: *)
Resistor, 432kΩ, ±1%, 50mW, ±200ppm/℃, -55℃~+125℃, SMD 0201; Manufacturer: Uniroyal; Manufacturer Part Number: RC0201FR-07432KL; Supplier 1: LCSC; Supplier Part Number 1: C474727; JLCPCB Part Number: C474727; Power Rating: 50mW; Category: Resistors; Package Size: 0201; JLCPCB Basic Part: Yes; Tolerance: ±1%; Temperature Coefficient: ±200ppm/℃; Temperature Rating: -55℃~+125℃; ComponentLink1Description: Datasheet; ComponentLink1URL: https://wmsc.lcsc.com/wmsc/upload/file/pdf/v2/lcsc/2311211101_YAGEO-RC0201FR-07432KL_C474727.pdf; ComponentLink2Description: JLCPCB Part URL; ComponentLink2URL: https://jlcpcb.com/partdetail/C474727
pins: 1, 2
1 alternate drawing of the same symbol

## RC0201FR-07442RL
designator R?  Resistance: 442Ω  (hidden comment: *)
Resistor, 442Ω, ±1%, 50mW, 25V, ±200ppm/℃, -55℃~+125℃, SMD 0201; Manufacturer: Uniroyal; Manufacturer Part Number: RC0201FR-07442RL; Supplier 1: LCSC; Supplier Part Number 1: C327386; JLCPCB Part Number: C327386; Power Rating: 50mW; Category: Resistors; Package Size: 0201; JLCPCB Basic Part: Yes; Tolerance: ±1%; Voltage Rating: 25V; Temperature Coefficient: ±200ppm/℃; Temperature Rating: -55℃~+125℃; ComponentLink1Description: Datasheet; ComponentLink1URL: https://wmsc.lcsc.com/wmsc/upload/file/pdf/v2/lcsc/1811141242_YAGEO-RC0201FR-07442RL_C327386.pdf; ComponentLink2Description: JLCPCB Part URL; ComponentLink2URL: https://jlcpcb.com/partdetail/C327386
pins: 1, 2
1 alternate drawing of the same symbol

## RC0201FR-07470KL
designator R?  Resistance: 470kΩ  (hidden comment: *)
Resistor, 470kΩ, ±1%, 50mW, 25V, ±200ppm/℃, -55℃~+125℃, SMD 0201; Manufacturer: Uniroyal; Manufacturer Part Number: RC0201FR-07470KL; Supplier 1: LCSC; Supplier Part Number 1: C274343; JLCPCB Part Number: C274343; Power Rating: 50mW; Category: Resistors; Package Size: 0201; JLCPCB Basic Part: Yes; Tolerance: ±1%; Voltage Rating: 25V; Temperature Coefficient: ±200ppm/℃; Temperature Rating: -55℃~+125℃; ComponentLink1Description: Datasheet; ComponentLink1URL: https://wmsc.lcsc.com/wmsc/upload/file/pdf/v2/lcsc/2304140030_YAGEO-RC0201FR-07470KL_C274343.pdf; ComponentLink2Description: JLCPCB Part URL; ComponentLink2URL: https://jlcpcb.com/partdetail/C274343
pins: 1, 2
1 alternate drawing of the same symbol

## RC0201FR-07470RL
designator R?  Resistance: 470Ω  (hidden comment: *)
Resistor, 470Ω, ±1%, 50mW, 25V, ±200ppm/℃, -55℃~+125℃, SMD 0201; Manufacturer: Uniroyal; Manufacturer Part Number: RC0201FR-07470RL; Supplier 1: LCSC; Supplier Part Number 1: C295802; JLCPCB Part Number: C295802; Power Rating: 50mW; Category: Resistors; Package Size: 0201; JLCPCB Basic Part: Yes; Tolerance: ±1%; Voltage Rating: 25V; Temperature Coefficient: ±200ppm/℃; Temperature Rating: -55℃~+125℃; ComponentLink1Description: Datasheet; ComponentLink1URL: https://wmsc.lcsc.com/wmsc/upload/file/pdf/v2/lcsc/2304140030_YAGEO-RC0201FR-07470RL_C295802.pdf; ComponentLink2Description: JLCPCB Part URL; ComponentLink2URL: https://jlcpcb.com/partdetail/C295802
pins: 1, 2
1 alternate drawing of the same symbol

## RC0201FR-07475RL
designator R?  Resistance: 475Ω  (hidden comment: *)
Resistor, 475Ω, ±1%, 50mW, 25V, ±200ppm/℃, -55℃~+125℃, SMD 0201; Manufacturer: Uniroyal; Manufacturer Part Number: RC0201FR-07475RL; Supplier 1: LCSC; Supplier Part Number 1: C273327; JLCPCB Part Number: C273327; Power Rating: 50mW; Category: Resistors; Package Size: 0201; JLCPCB Basic Part: Yes; Tolerance: ±1%; Voltage Rating: 25V; Temperature Coefficient: ±200ppm/℃; Temperature Rating: -55℃~+125℃; ComponentLink1Description: Datasheet; ComponentLink1URL: https://wmsc.lcsc.com/wmsc/upload/file/pdf/v2/lcsc/2112151830_YAGEO-RC0201FR-07475RL_C273327.pdf; ComponentLink2Description: JLCPCB Part URL; ComponentLink2URL: https://jlcpcb.com/partdetail/C273327
pins: 1, 2
1 alternate drawing of the same symbol

## RC0201FR-07499KL
designator R?  Resistance: 499kΩ  (hidden comment: *)
Resistor, 499kΩ, ±1%, 50mW, 25V, ±200ppm/℃, -55℃~+125℃, SMD 0201; Manufacturer: Uniroyal; Manufacturer Part Number: RC0201FR-07499KL; Supplier 1: LCSC; Supplier Part Number 1: C138138; JLCPCB Part Number: C138138; Power Rating: 50mW; Category: Resistors; Package Size: 0201; JLCPCB Basic Part: Yes; Tolerance: ±1%; Voltage Rating: 25V; Temperature Coefficient: ±200ppm/℃; Temperature Rating: -55℃~+125℃; ComponentLink1Description: Datasheet; ComponentLink1URL: https://wmsc.lcsc.com/wmsc/upload/file/pdf/v2/lcsc/2304140030_YAGEO-RC0201FR-07499KL_C138138.pdf; ComponentLink2Description: JLCPCB Part URL; ComponentLink2URL: https://jlcpcb.com/partdetail/C138138
pins: 1, 2
1 alternate drawing of the same symbol